# Altium footprint library Face_InMain1V0.PcbLib: 83 footprints (part 3 of 6)
Each footprint in its own frame and in the unit in brackets; x right, y up, seen from the top. Pads: shape width x height; smd on the part's side, far side on the other; paste and mask are expansions set on the pad; w line width, h text height; cw(c..) or ccw(c..) is an arc to the next point about the centre after c.
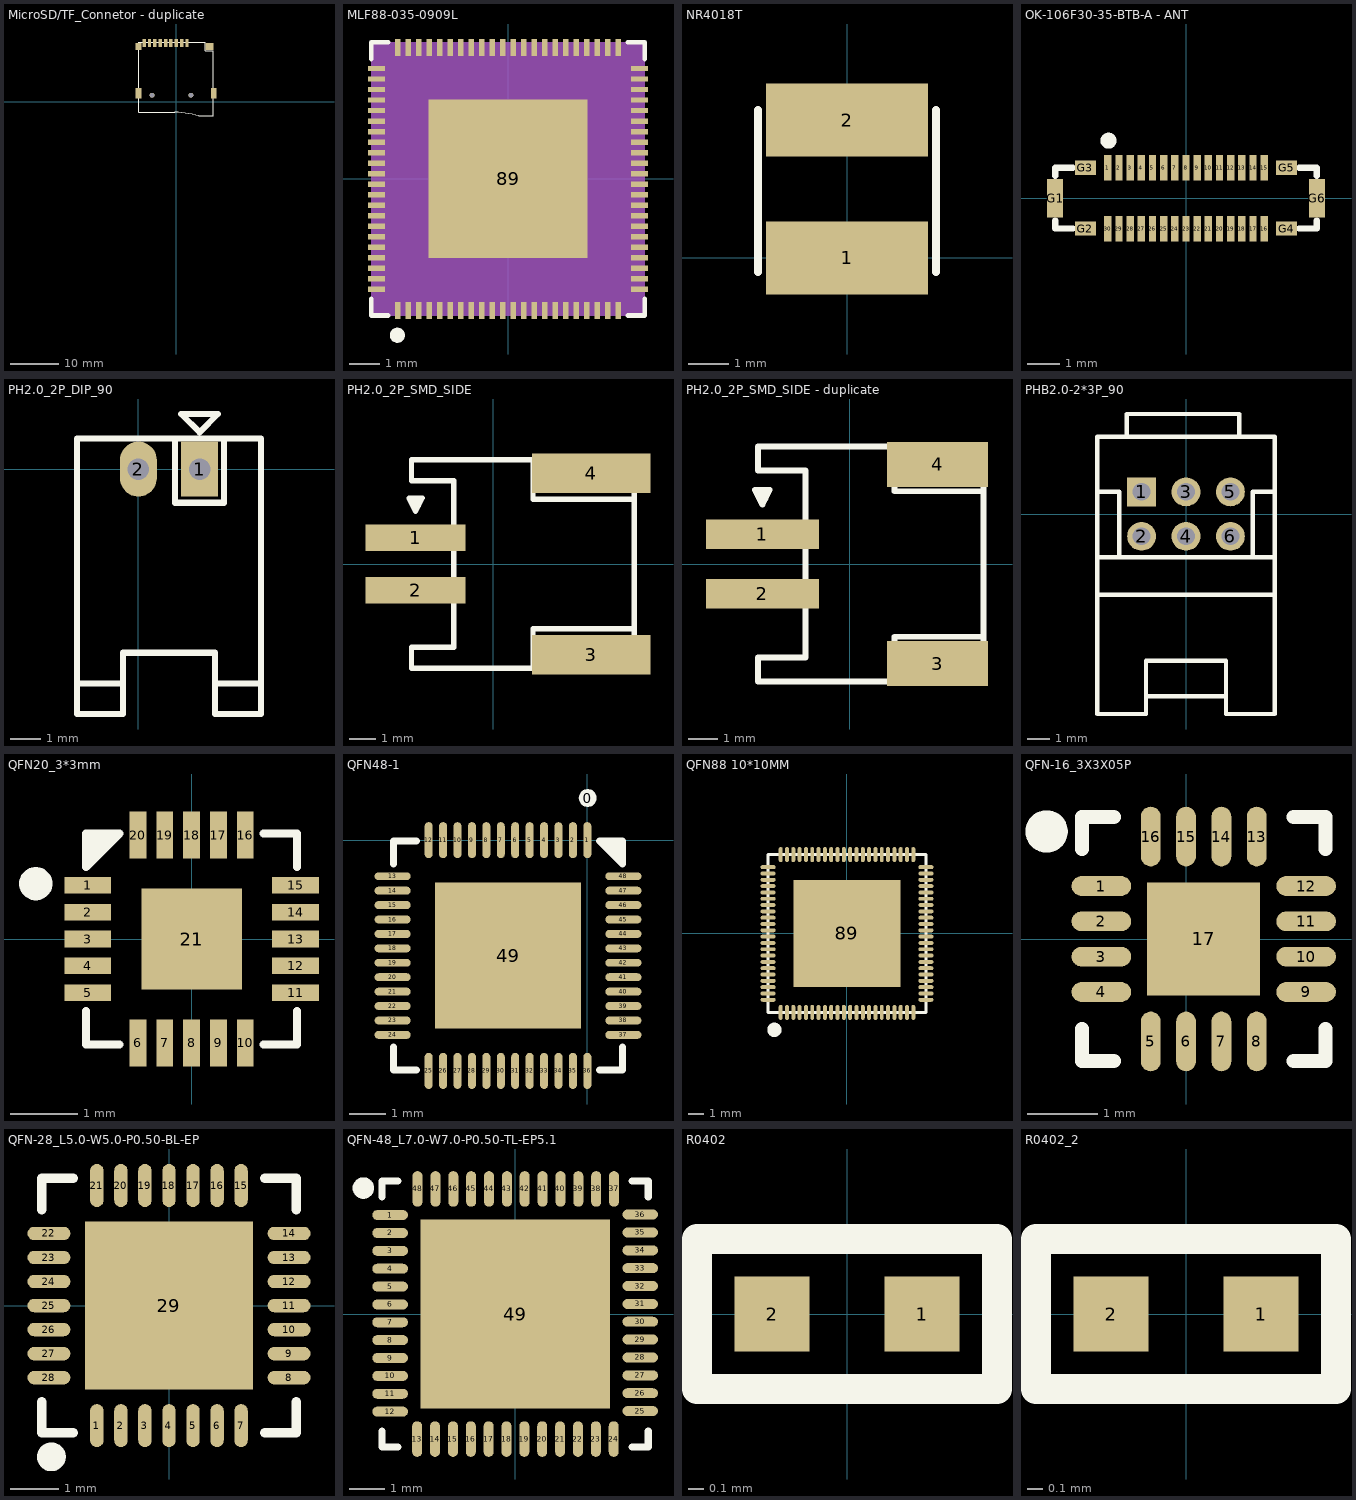
[diagram p2: the footprints below, top view; thin cyan lines are the x and y axes]

## MicroSD/TF_Connetor - duplicate [mm]
pads (15):
  round 1 hole 1 mask+0: 0(-4.955,1.3) 0(3.025,1.3)
  rect 0.7x1.6 smd mask+0.05: 1(2.225,12.05) 2(1.125,12.05) 3(0.025,12.05) 4(-1.075,12.05) 5(-2.175,12.05) 6(-3.275,12.05) 7(-4.375,12.05) 8(-5.475,12.05) 9(-6.575,12.05)
  rect 1.2x2.2 smd mask+0.05: 10(-7.775,1.7) 10(7.725,1.7)
  rect 1.2x1.4 smd mask+0.05: 10(-7.775,11.3)
  rect 1.6x1.4 smd mask+0.05: 10(6.825,11.3)
Top Overlay:
  lines w0.2: -7.65,-2.153 -7.65,12.15 5.975,12.15 5.975,10.475 7.65,10.475 7.65,-2.95 4.675,-2.95 ccw(c-1.475,-25.45) -0.325,-2.153 -7.65,-2.153
3D body "User Library-MEM2055-00-190-01-A_revG.STEP": height 1.95, standoff -0.5, extent -7.975,-2.675 8.025,12.575

## MLF88-035-0909L [mil] "MLF88-035-0909L"
pads (89):
  rect 7x22 smd: 1(-144.69,-172.42) 2(-130.91,-172.42) 3(-117.13,-172.42) 4(-103.35,-172.42) 5(-89.57,-172.42) 6(-75.79,-172.42) 7(-62.01,-172.42) 8(-48.23,-172.42) 9(-34.45,-172.42) 10(-20.67,-172.42) 11(-6.89,-172.42) 12(6.89,-172.42) 13(20.67,-172.42) 14(34.45,-172.42) 15(48.23,-172.42) 16(62.01,-172.42) 17(75.79,-172.42) 18(89.57,-172.42) 19(103.35,-172.42) 20(117.13,-172.42) 21(130.91,-172.42) 22(144.69,-172.42) 45(144.69,172.42) 46(130.91,172.42) 47(117.13,172.42) 48(103.35,172.42) 49(89.57,172.42) 50(75.79,172.42) 51(62.01,172.42) 52(48.23,172.42) 53(34.45,172.42) 54(20.67,172.42) 55(6.89,172.42) 56(-6.89,172.42) 57(-20.67,172.42) 58(-34.45,172.42) 59(-48.23,172.42) 60(-62.01,172.42) 61(-75.79,172.42) 62(-89.57,172.42) 63(-103.35,172.42) 64(-117.13,172.42) 65(-130.91,172.42) 66(-144.69,172.42)
  rect 22x7 smd: 23(172.42,-144.69) 24(172.42,-130.91) 25(172.42,-117.13) 26(172.42,-103.35) 27(172.42,-89.57) 28(172.42,-75.79) 29(172.42,-62.01) 30(172.42,-48.23) 31(172.42,-34.45) 32(172.42,-20.67) 33(172.42,-6.89) 34(172.42,6.89) 35(172.42,20.67) 36(172.42,34.45) 37(172.42,48.23) 38(172.42,62.01) 39(172.42,75.79) 40(172.42,89.57) 41(172.42,103.35) 42(172.42,117.13) 43(172.42,130.91) 44(172.42,144.69) 67(-172.42,144.69) 68(-172.42,130.91) 69(-172.42,117.13) 70(-172.42,103.35) 71(-172.42,89.57) 72(-172.42,75.79) 73(-172.42,62.01) 74(-172.42,48.23) 75(-172.42,34.45) 76(-172.42,20.67) 77(-172.42,6.89) 78(-172.42,-6.89) 79(-172.42,-20.67) 80(-172.42,-34.45) 81(-172.42,-48.23) 82(-172.42,-62.01) 83(-172.42,-75.79) 84(-172.42,-89.57) 85(-172.42,-103.35) 86(-172.42,-117.13) 87(-172.42,-130.91) 88(-172.42,-144.69)
  rect 208x208 smd: 89(0,0)
Top Overlay:
  lines w6: -179.13,-157.19 -179.13,-179.13 -157.19,-179.13 ; -179.13,157.19 -179.13,179.13 -157.19,179.13 ; 157.19,-179.13 179.13,-179.13 179.13,-157.19 ; 157.19,179.13 179.13,179.13 179.13,157.19
  lines w9.84: -140.08,-205.05 cw(c-145,-205) -140.08,-204.95
Mechanical 17:
  text "7" at -65.21,-172.42 h8
  text "89" at -6.4,0 h8
  text "74" at -178.82,48.23 h8
  text "73" at -178.82,62.01 h8
  text "69" at -178.82,117.13 h8
  text "9" at -37.65,-172.42 h8
  text "10" at -27.07,-172.42 h8
  text "72" at -178.82,75.79 h8
  text "45" at 138.29,172.42 h8
  text "5" at -92.77,-172.42 h8
  text "6" at -78.99,-172.42 h8
  text "35" at 166.02,20.67 h8
  text "52" at 41.83,172.42 h8
  text "51" at 55.61,172.42 h8
  text "33" at 166.02,-6.89 h8
  text "32" at 166.02,-20.67 h8
  text "50" at 69.39,172.42 h8
  text "76" at -178.82,20.67 h8
  text "8" at -51.43,-172.42 h8
  text "87" at -178.82,-130.91 h8
  text "61" at -82.19,172.42 h8
  text "56" at -13.29,172.42 h8
  text "65" at -137.31,172.42 h8
  text "66" at -151.09,172.42 h8
  text "64" at -123.53,172.42 h8
  text "68" at -178.82,130.91 h8
  text "63" at -109.75,172.42 h8
  text "37" at 166.02,48.23 h8
  text "31" at 166.02,-34.45 h8
  text "20" at 110.73,-172.42 h8
  text "11" at -13.29,-172.42 h8
  text "83" at -178.82,-75.79 h8
  text "59" at -54.63,172.42 h8
  text "26" at 166.02,-103.35 h8
  text "24" at 166.02,-130.91 h8
  text "90" at -33.96,132.48 h8
  text "79" at -178.82,-20.67 h8
  text "77" at -178.82,6.89 h8
  text "62" at -95.97,172.42 h8
  text "53" at 28.05,172.42 h8
  text "36" at 166.02,34.45 h8
  text "16" at 55.61,-172.42 h8
  text "58" at -40.85,172.42 h8
  text "60" at -68.41,172.42 h8
  text "54" at 14.27,172.42 h8
  text "55" at 0.49,172.42 h8
  text "91" at -138.88,13.78 h8
  text "78" at -178.82,-6.89 h8
  text "75" at -178.82,34.45 h8
  text "48" at 96.95,172.42 h8
  text "80" at -178.82,-34.45 h8
  text "85" at -178.82,-103.35 h8
  text "39" at 166.02,75.79 h8
  text "38" at 166.02,62.01 h8
  text "41" at 166.02,103.35 h8
  text "40" at 166.02,89.57 h8
  text "43" at 166.02,130.91 h8
  text "42" at 166.02,117.13 h8
  text "1" at -147.89,-172.42 h8
  text "2" at -134.11,-172.42 h8
  text "88" at -178.82,-144.69 h8
  text "84" at -178.82,-89.57 h8
  text "23" at 166.02,-144.69 h8
  text "21" at 124.51,-172.42 h8
  text "19" at 96.95,-172.42 h8
  text "18" at 83.17,-172.42 h8
  text "17" at 69.39,-172.42 h8
  text "13" at 14.27,-172.42 h8
  text "12" at 0.49,-172.42 h8
  text "82" at -178.82,-62.01 h8
  text "27" at 166.02,-89.57 h8
  text "29" at 166.02,-62.01 h8
  text "30" at 166.02,-48.23 h8
  text "28" at 166.02,-75.79 h8
  text "70" at -178.82,103.35 h8
  text "4" at -106.55,-172.42 h8
  text "81" at -178.82,-48.23 h8
  text "22" at 138.29,-172.42 h8
  text "57" at -27.07,172.42 h8
  text "67" at -178.82,144.69 h8
  text "14" at 28.05,-172.42 h8
  text "44" at 166.02,144.69 h8
  text "3" at -120.33,-172.42 h8
  text "86" at -178.82,-117.13 h8
  text "25" at 166.02,-117.13 h8
  text "15" at 41.83,-172.42 h8
  text "34" at 166.02,6.89 h8
  text "71" at -178.82,89.57 h8
  text "49" at 83.17,172.42 h8
  text "47" at 110.73,172.42 h8
  text "46" at 124.51,172.42 h8
Mechanical 19:
  region: -179.13,-179.13 -179.13,179.13 179.13,179.13 179.13,-179.13

## NR4018T [mm]
pads (2):
  rect 4x1.8 smd: 1(0,0) 2(0,3.4)
Top Overlay:
  lines w0.2: -2.2,-0.35 -2.2,3.65 ; 2.2,-0.35 2.2,3.65
3D body: height 1.8, standoff 0, extent -2,-0.2 2,3.6

## OK-106F30-35-BTB-A - ANT [mm] "TSSOP, 30-Leads, Body 5.50x3.13mm, Pitch 0.35mm, IPC Medium Density"
height 1
pads (36):
  rect 0.23x0.8 smd mask+0.005: 1(-2.45,0.95) 2(-2.1,0.95) 3(-1.75,0.95) 4(-1.4,0.95) 5(-1.05,0.95) 6(-0.7,0.95) 7(-0.35,0.95) 8(0,0.95) 9(0.35,0.95) 10(0.7,0.95) 11(1.05,0.95) 12(1.4,0.95) 13(1.75,0.95) 14(2.1,0.95) 15(2.45,0.95) 16(2.45,-0.95) 17(2.1,-0.95) 18(1.75,-0.95) 19(1.4,-0.95) 20(1.05,-0.95) 21(0.7,-0.95) 22(0.35,-0.95) 23(0,-0.95) 24(-0.35,-0.95) 25(-0.7,-0.95) 26(-1.05,-0.95) 27(-1.4,-0.95) 28(-1.75,-0.95) 29(-2.1,-0.95) 30(-2.45,-0.95)
  rect 0.5x1.2 smd mask+0.05: G1(-4.1,0) G6(4.1,0)
  rect 0.66x0.45 smd mask+0.05: G2(-3.15,-0.95) G3(-3.15,0.95) G4(3.15,-0.95) G5(3.15,0.95)
Top Overlay:
  lines w0.2: -4.1,-0.7 -4.1,-0.95 -3.55,-0.95 ; -4.1,0.7 -4.1,0.95 -3.55,0.95 ; 3.55,-0.95 4.1,-0.95 4.1,-0.7 ; 3.55,0.95 4.1,0.95 4.1,0.7
  lines w0.25: -2.304,1.8 cw(c-2.429,1.802) -2.304,1.803

## PH2.0_2P_DIP_90 [mm] "WAFER 2.0mm DIP 90"
height 4.4
pads (2):
  rect 1.2x1.8 hole 0.7: 1(2,0)
  oval 1.2x1.8 hole 0.7: 2(0,0)
Top Overlay:
  lines w0.2: -2,-7 -0.5,-7 ; 1.2,1 1.2,-1.1 2.8,-1.1 2.8,1 ; 2.5,-7 4,-7 ; -2,-8 -0.5,-8 -0.5,-6 2.5,-6 2.5,-8 4,-8 4,1 -2,1 -2,-8 ; 1.4,1.8 2.6,1.8 2,1.2 1.4,1.8
Bottom Overlay:
  lines w0.2: 1.2,-1.1 1.2,1 2.8,1 2.8,-1.1 1.2,-1.1
3D body: height 4.4, standoff 0, extent -1.95,-6 4.05,0.025

## PH2.0_2P_SMD_SIDE [mm] "WAFER 2.0mm SIDE ENTRY SMT"
height 5.6
pads (4):
  rect 3.8x1 smd: 1(-2.95,1) 2(-2.95,-1)
  rect 4.5x1.5 smd: 3(3.7,-3.429) 4(3.7,3.429)
Top Overlay:
  lines w0.2: -3.05,2.2 -3.05,2.5 ; -2.95,2.5 -2.95,2 ; -2.85,2.2 -2.85,2.5 ; 1.5,-3.95 1.5,-2.45 5.334,-2.45 ; 1.5,3.95 1.5,2.45 5.334,2.45 ; 4.699,3.45 4.699,3.95 -3.1,3.95 -3.1,3.15 -1.5,3.15 -1.5,-3.15 -3.1,-3.15 -3.1,-3.95 4.699,-3.95 4.699,-3.45 ; 5.334,-3.05 1.6,-3.05 1.6,-3.45 4.699,-3.45 ; 5.334,3.05 1.6,3.05 1.6,3.45 5.334,3.45 5.334,-3.45 4.699,-3.45 ; -2.95,2 -3.2,2.5 -2.7,2.5 -2.95,2
3D body "S2B-PH-SM4-TB.STEP": height 5.5, standoff -0.1, extent -4.1,-3.95 4.5,3.95

## PH2.0_2P_SMD_SIDE - duplicate [mm] "WAFER 2.0mm SIDE ENTRY SMT"
height 5.6
pads (4):
  rect 3.8x1 smd: 1(-2.95,1) 2(-2.95,-1)
  rect 3.4x1.5 smd: 3(2.95,-3.35) 4(2.95,3.35)
Top Overlay:
  lines w0.2: -3.05,2.2 -3.05,2.5 ; -2.95,2.5 -2.95,2 ; -2.85,2.2 -2.85,2.5 ; 1.5,-3.95 1.5,-2.45 4.5,-2.45 ; 1.5,3.95 1.5,2.45 4.5,2.45 ; 3.7,-3.45 3.7,-3.95 -3.1,-3.95 -3.1,-3.15 -1.5,-3.15 -1.5,3.15 -3.1,3.15 -3.1,3.95 3.7,3.95 3.7,3.45 ; 4.5,-3.05 1.6,-3.05 1.6,-3.45 4.5,-3.45 4.5,3.45 1.6,3.45 1.6,3.05 4.5,3.05 ; -2.95,2 -3.2,2.5 -2.7,2.5 -2.95,2
3D body "S2B-PH-SM4-TB.STEP": height 5.5, standoff -0.1, extent -4.1,-3.95 4.5,3.95

## PHB2.0-2*3P_90 [mm]
pads (6):
  rect 1.3x1.3 hole 0.8: 1(-2,1)
  round 1.3 hole 0.8: 2(-2,-1) 3(0,1) 4(0,-1) 5(2,1) 6(2,-1)
Top Overlay:
  lines w0.2: -4,-1.95 4,-1.95 ; -3,-1.95 -3,1 -4,1 -4,-9 -1.8,-9 -1.8,-6.6 1.8,-6.6 1.8,-9 4,-9 4,1 3,1 3,-1.95 ; -2.66,3.489 -2.66,4.505 2.394,4.505 2.394,3.489 ; -1.8,-8.2 1.8,-8.2 ; -4,-3.623 -4,-1.845 -4,1.711 -4,3.489 4,3.489 4,-3.623 -4,-3.623
3D body "User Library-PHB2_0MM_DIP180-2x3.STEP": height 7.6, standoff -2, extent -4,-3.658 4,4.442

## QFN20_3*3mm [mm]
height 6.1
pads (22):
  rect 0.7x0.25 smd mask+0.05: 1(-1.55,0.8) 2(-1.55,0.4) 3(-1.55,0) 4(-1.55,-0.4) 5(-1.55,-0.8) 11(1.55,-0.8) 12(1.55,-0.4) 13(1.55,0) 14(1.55,0.4) 15(1.55,0.8)
  rect 0.25x0.7 smd mask+0.05: 6(-0.8,-1.55) 7(-0.4,-1.55) 8(0,-1.55) 9(0.4,-1.55) 10(0.8,-1.55) 16(0.8,1.55) 17(0.4,1.55) 18(0,1.55) 19(-0.4,1.55) 20(-0.8,1.55)
  rect 1.5x1.5 smd mask+0.05: 21(0,0)
  round 0.5 on Top Overlay: ""(-2.325,0.825)
Top Overlay:
  lines w0.12: -1.575,-1.075 -1.575,-1.575 -1.075,-1.575 ; -1.375,1.575 -1.55,1.4 -1.55,1.25 -1.225,1.575 -1.075,1.575 ; 1.075,-1.575 1.575,-1.575 1.575,-1.075 ; 1.075,1.575 1.575,1.575 1.575,1.075 ; -1.075,1.575 -1.575,1.575 -1.575,1.075 -1.075,1.575
3D body "User Library-QFN-20-2.STEP": height 0.75, standoff 0, extent -1.51,-1.51 1.51,1.51

## QFN48-1 [mm]
pads (50):
  round 0.5 on Top Overlay: 0(0.01,1.169)
  oval 0.22x1 smd: 1(0,0) 2(-0.4,0) 3(-0.8,0) 4(-1.2,0) 5(-1.6,0) 6(-2,0) 7(-2.4,0) 8(-2.8,0) 9(-3.2,0) 10(-3.6,0) 11(-4,0) 12(-4.4,0) 25(-4.4,-6.4) 26(-4,-6.4) 27(-3.6,-6.4) 28(-3.2,-6.4) 29(-2.8,-6.4) 30(-2.4,-6.4) 31(-2,-6.4) 32(-1.6,-6.4) 33(-1.2,-6.4) 34(-0.8,-6.4) 35(-0.4,-6.4) 36(0,-6.4)
  oval 1x0.22 smd: 13(-5.4,-1) 14(-5.4,-1.4) 15(-5.4,-1.8) 16(-5.4,-2.2) 17(-5.4,-2.6) 18(-5.4,-3) 19(-5.4,-3.4) 20(-5.4,-3.8) 21(-5.4,-4.2) 22(-5.4,-4.6) 23(-5.4,-5) 24(-5.4,-5.4) 37(1,-5.4) 38(1,-5) 39(1,-4.6) 40(1,-4.2) 41(1,-3.8) 42(1,-3.4) 43(1,-3) 44(1,-2.6) 45(1,-2.2) 46(1,-1.8) 47(1,-1.4) 48(1,-1)
  rect 4.05x4.05 smd: 49(-2.2,-3.2)
Top Overlay:
  lines w0.2: -5.375,-5.74 -5.375,-6.375 -4.74,-6.375 ; -5.375,-0.66 -5.375,-0.025 -4.74,-0.025 ; 0.34,-6.375 0.975,-6.375 0.975,-5.74 ; 0.594,-0.076 0.975,-0.457 0.975,-0.482 ; 0.797,-0.127 0.95,-0.279 ; 0.34,-0.025 0.975,-0.025 0.975,-0.66 0.34,-0.025
3D body "User Library-QFN48.STEP": height 0.85, standoff -0.02, extent -5.224,-6.211 0.816,-0.171

## QFN88 10*10MM [mm]
pads (89):
  oval 0.25x0.95 smd: 1(-4.2,-5) 2(-3.8,-5) 3(-3.4,-5) 4(-3,-5) 5(-2.6,-5) 6(-2.2,-5) 7(-1.8,-5) 8(-1.4,-5) 9(-1,-5) 10(-0.6,-5) 11(-0.2,-5) 12(0.2,-5) 13(0.6,-5) 14(1,-5) 15(1.4,-5) 16(1.8,-5) 17(2.2,-5) 18(2.6,-5) 19(3,-5) 20(3.4,-5) 21(3.8,-5) 22(4.2,-5) 45(4.2,5) 46(3.8,5) 47(3.4,5) 48(3,5) 49(2.6,5) 50(2.2,5) 51(1.8,5) 52(1.4,5) 53(1,5) 54(0.6,5) 55(0.2,5) 56(-0.2,5) 57(-0.6,5) 58(-1,5) 59(-1.4,5) 60(-1.8,5) 61(-2.2,5) 62(-2.6,5) 63(-3,5) 64(-3.4,5) 65(-3.8,5) 66(-4.2,5)
  oval 0.95x0.25 smd: 23(5,-4.2) 24(5,-3.8) 25(5,-3.4) 26(5,-3) 27(5,-2.6) 28(5,-2.2) 29(5,-1.8) 30(5,-1.4) 31(5,-1) 32(5,-0.6) 33(5,-0.2) 34(5,0.2) 35(5,0.6) 36(5,1) 37(5,1.4) 38(5,1.8) 39(5,2.2) 40(5,2.6) 41(5,3) 42(5,3.4) 43(5,3.8) 44(5,4.2) 67(-5,4.2) 68(-5,3.8) 69(-5,3.4) 70(-5,3) 71(-5,2.6) 72(-5,2.2) 73(-5,1.8) 74(-5,1.4) 75(-5,1) 76(-5,0.6) 77(-5,0.2) 78(-5,-0.2) 79(-5,-0.6) 80(-5,-1) 81(-5,-1.4) 82(-5,-1.8) 83(-5,-2.2) 84(-5,-2.6) 85(-5,-3) 86(-5,-3.4) 87(-5,-3.8) 88(-5,-4.2)
  rect 6.8x6.8 smd: 89(0,0)
Top Overlay:
  circle w0.5: c-4.6,-6.1 r0.2
  lines w0.2: -5,-5 5,-5 5,5 -5,5 -5,-5
Top Solder:
  rectangle: -4.5,4.4 4.5,5.6
  region: -4.4,-4.5 -4.4,4.5 -5.6,4.5 -5.6,-4.5
  region: 4.5,-4.4 -4.5,-4.4 -4.5,-5.6 4.5,-5.6
  region: 4.4,4.5 4.4,-4.5 5.6,-4.5 5.6,4.5
3D body "User Library-QFN88.STEP": height 0.85, standoff -0.02, extent -5.01,-5.01 5.01,5.01

## QFN-16_3X3X05P [mm]
pads (17):
  oval 0.846x0.28 smd: 1(-1.199,0.75) 2(-1.199,0.25) 3(-1.199,-0.25) 4(-1.199,-0.75) 9(1.701,-0.75) 10(1.701,-0.25) 11(1.701,0.25) 12(1.701,0.75)
  oval 0.28x0.846 smd: 5(-0.499,-1.45) 6(0.001,-1.45) 7(0.501,-1.45) 8(1.001,-1.45) 13(1.001,1.45) 14(0.501,1.45) 15(0.001,1.45) 16(-0.499,1.45)
  rect 1.6x1.6 smd: 17(0.251,0)
Top Overlay:
  lines w0.2: -1.474,-1.275 -1.474,-1.725 -1.024,-1.725 ; -1.474,1.275 -1.474,1.725 -1.024,1.725 ; 1.526,-1.725 1.976,-1.725 1.976,-1.275 ; 1.526,1.725 1.976,1.725 1.976,1.275
  lines w0.3: -1.824,1.521 cw(c-1.974,1.523) -1.824,1.524

## QFN-28_L5.0-W5.0-P0.50-BL-EP [mm]
pads (29):
  oval 0.28x0.896 smd: 1(-1.501,-2.5) 2(-1.001,-2.5) 3(-0.501,-2.5) 4(0,-2.5) 5(0.5,-2.5) 6(1.001,-2.5) 7(1.501,-2.5) 15(1.501,2.5) 16(1.001,2.5) 17(0.5,2.5) 18(0,2.5) 19(-0.501,2.5) 20(-1.001,2.5) 21(-1.501,2.5)
  oval 0.896x0.28 smd: 8(2.5,-1.501) 9(2.5,-1.001) 10(2.5,-0.501) 11(2.5,0) 12(2.5,0.5) 13(2.5,1.001) 14(2.5,1.501) 22(-2.5,1.501) 23(-2.5,1.001) 24(-2.5,0.5) 25(-2.5,0) 26(-2.5,-0.501) 27(-2.5,-1.001) 28(-2.5,-1.501)
  rect 3.5x3.5 smd: 29(0,0)
Top Overlay:
  lines w0.2: -2.65,-2 -2.65,-2.65 -2,-2.65 ; -2.65,2 -2.65,2.65 -2,2.65 ; 2,-2.65 2.65,-2.65 2.65,-2 ; 2,2.65 2.65,2.65 2.65,2
  lines w0.3: -2.451,-3 ccw(c-2.45,-3.15) -2.449,-3

## QFN-48_L7.0-W7.0-P0.50-TL-EP5.1 [mm]
pads (49):
  oval 0.996x0.28 smd: 1(-3.5,2.769) 2(-3.5,2.268) 3(-3.5,1.768) 4(-3.5,1.268) 5(-3.5,0.767) 6(-3.5,0.267) 7(-3.5,-0.231) 8(-3.5,-0.731) 9(-3.5,-1.232) 10(-3.5,-1.732) 11(-3.5,-2.233) 12(-3.5,-2.733) 25(3.5,-2.718) 26(3.5,-2.217) 27(3.5,-1.717) 28(3.5,-1.217) 29(3.5,-0.716) 30(3.5,-0.216) 31(3.5,0.282) 32(3.5,0.782) 33(3.5,1.283) 34(3.5,1.783) 35(3.5,2.284) 36(3.5,2.784)
  oval 0.28x0.996 smd: 13(-2.743,-3.5) 14(-2.243,-3.5) 15(-1.742,-3.5) 16(-1.242,-3.5) 17(-0.742,-3.5) 18(-0.241,-3.5) 19(0.257,-3.5) 20(0.757,-3.5) 21(1.257,-3.5) 22(1.758,-3.5) 23(2.258,-3.5) 24(2.759,-3.5) 37(2.769,3.5) 38(2.268,3.5) 39(1.768,3.5) 40(1.268,3.5) 41(0.767,3.5) 42(0.267,3.5) 43(-0.231,3.5) 44(-0.731,3.5) 45(-1.232,3.5) 46(-1.732,3.5) 47(-2.233,3.5) 48(-2.733,3.5)
  rect 5.3x5.3 smd: 49(0,0)
Top Overlay:
  lines w0.2: -3.725,-3.275 -3.725,-3.725 -3.275,-3.725 ; -3.725,3.275 -3.725,3.725 -3.275,3.725 ; 3.275,-3.725 3.725,-3.725 3.725,-3.275 ; 3.275,3.725 3.725,3.725 3.725,3.275
  lines w0.3: -4.099,3.523 cw(c-4.249,3.524) -4.099,3.526
3D body "ALSRobot-QFN48 7x7.STEP": height 0.78, standoff -0.02, extent -3.51,-3.51 3.51,3.51

## R0402 [mm]
pads (2):
  rect 0.5x0.5 smd: 1(0.5,0) 2(-0.5,0)
Top Overlay:
  lines w0.2: -1,-0.5 1,-0.5 1,0.5 -1,0.5 -1,-0.5
3D body "User Library-R_0402.STEP": height 0.35, standoff 0, extent -0.5,-0.25 0.5,0.25

## R0402_2 [mm]
pads (2):
  rect 0.5x0.5 smd: 1(0.5,0) 2(-0.5,0)
Top Overlay:
  lines w0.2: -1,-0.5 1,-0.5 1,0.5 -1,0.5 -1,-0.5
3D body "User Library-R_0402.STEP": height 0.35, standoff 0, extent -0.5,-0.25 0.5,0.25